# Altium footprint library Miscellaneous.PcbLib: 74 footprints (part 3 of 5)
Each footprint in its own frame and in the unit in brackets; x right, y up, seen from the top. Pads: shape width x height; smd on the part's side, far side on the other; paste and mask are expansions set on the pad; w line width, h text height; cw(c..) or ccw(c..) is an arc to the next point about the centre after c.
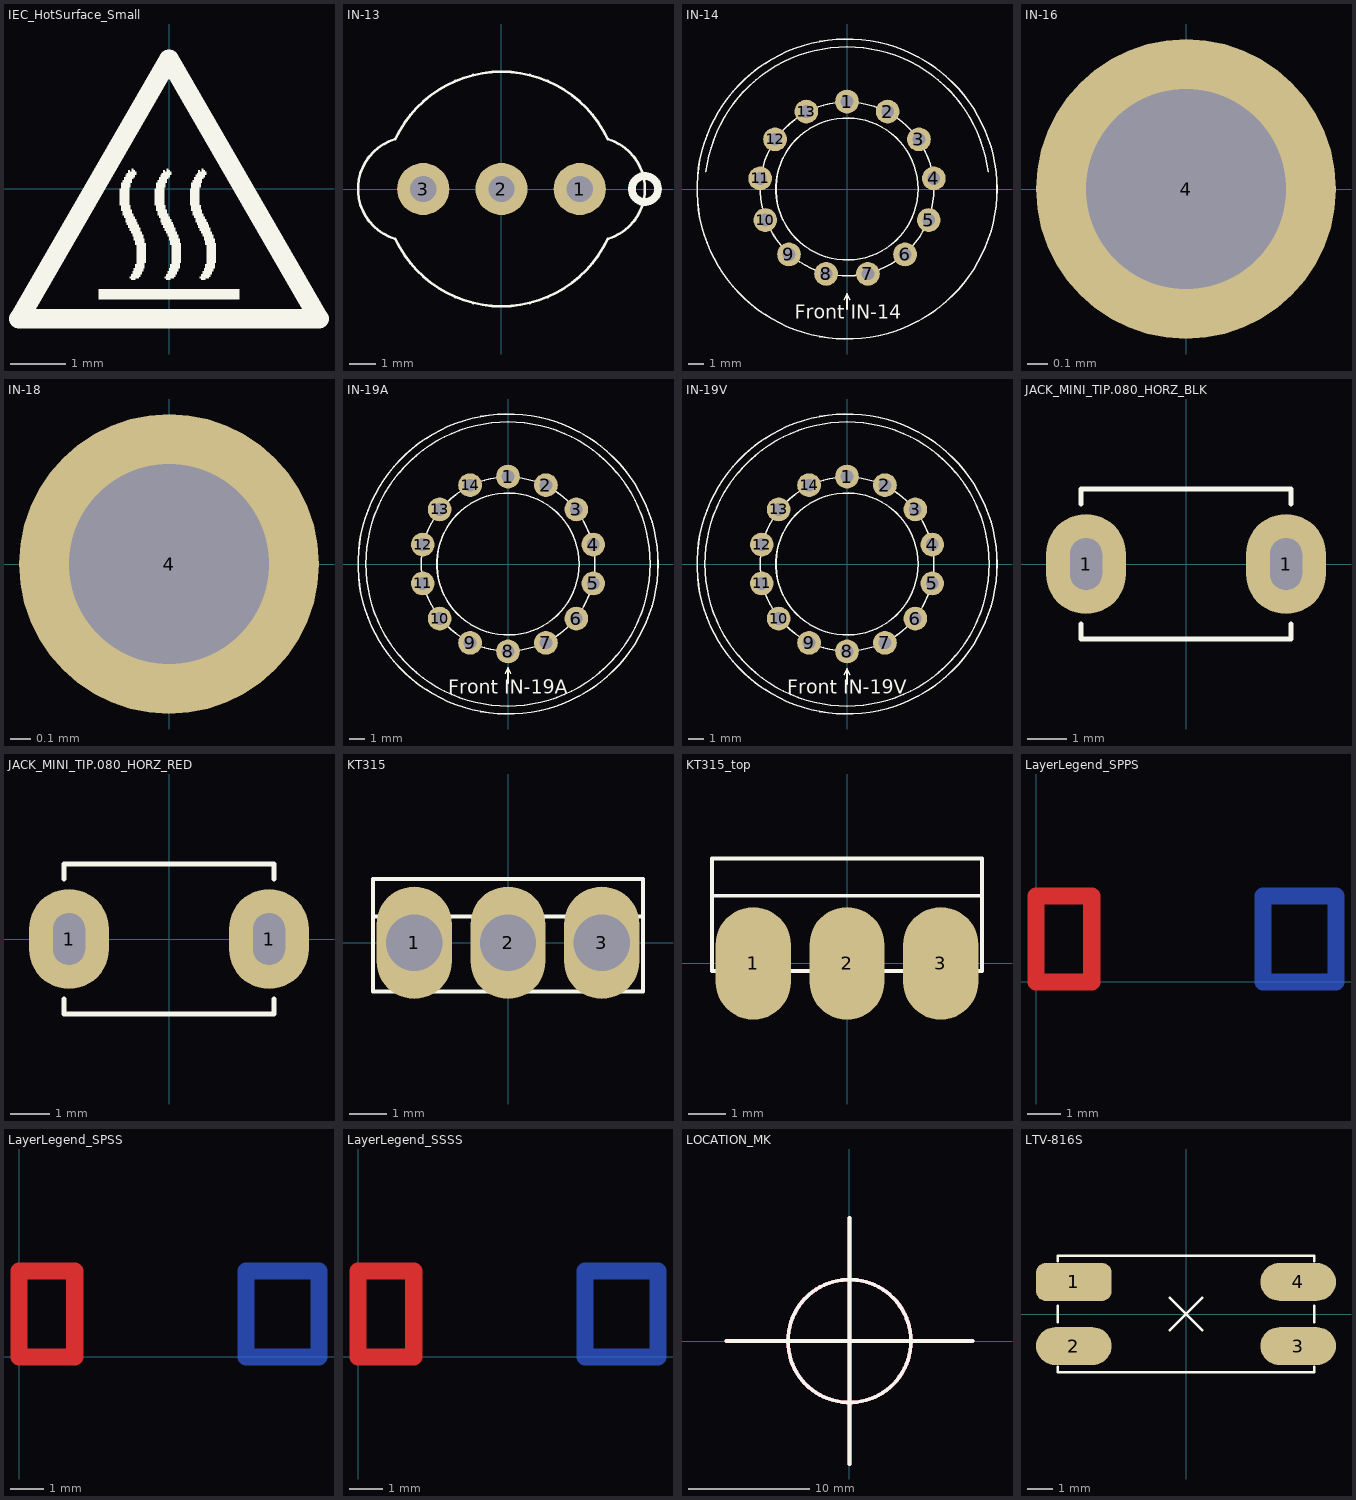
[diagram p2: the footprints below, top view; thin cyan lines are the x and y axes]

## IEC_HotSurface_Small [mil]
height 43.31
Top Overlay:
  drawing of 10 lines, arcs and shapes, not listed

## IN-13 [mm]
pads (3):
  round 2 hole 1: 1(3,0) 2(0,0) 3(-3,0)
Top Overlay:
  circle w0.3: c5.5,0 r0.5
  lines w0.1: -4.071,-1.917 ccw(c0,0) 4.071,-1.917 ccw(c3.5,0) 4.071,1.917 ccw(c0,0) -4.071,1.917 ccw(c-3.5,0) -4.071,-1.917
3D body: height 8, standoff 1, extent -5.5,-5.5 5.5,5.5
3D body: height 161, standoff 1, extent -4.464,-4.491 4.5,4.491

## IN-14 [mm]
pads (13):
  round 1.5 hole 0.8: 1(0,5.54) 2(2.575,4.905) 3(4.559,3.147) 4(5.5,0.668) 5(5.18,-1.964) 6(3.674,-4.147) 7(1.326,-5.379) 8(-1.326,-5.379) 9(-3.674,-4.147) 10(-5.18,-1.965) 11(-5.5,0.667) 12(-4.56,3.147) 13(-2.575,4.905)
Top Overlay:
  circle w0.1: c0,0 r9.5
  circle w0.1: c0,0 r4.5
  circle w0.1: c0,0 r5.5
  lines w0.1: -8.934,1.085 cw(c0,0) 8.934,1.084 ; -0.176,-6.996 0,-6.644 ; 0,-7.604 0,-6.644 ; 0.176,-6.996 0,-6.644
  text "Front IN-14" at -3.305,-8.514 h1.5
Bottom Overlay:
  text "Anode" at 1.912,6.568 h1.5
  text "k\",\"" at -2.582,6.291 h1.5
  text "k\"1\"" at -5.097,3.801 h1.5
  text "k\"2\"" at -6.376,0.427 h1.5
  text "k\"3\"" at -5.941,-3.148 h1.5
  text "k\"4\"" at -3.891,-6.124 h1.5
  text "k\"5\"" at -0.576,-7.307 h1.5
  text "k\"6\"" at 2.794,-7.309 h1.5
  text "k\"7\"" at 5.777,-5.749 h1.5
  text "k\"8\"" at 8.159,-3.147 h1.5
  text "k\"9\"" at 8.594,0.435 h1.5
  text "k\"0\"" at 7.314,3.81 h1.5
  text "k\",\"" at 4.426,6.292 h1.5
3D body "User Library-IN-14.step": height 62.61, standoff 0, extent -9.3,-9.5 9.3,9.3

## IN-16 [mm]
pads (1):
  round 1.5 hole 1: 4(0,0)

## IN-18 [mm]
pads (1):
  round 1.5 hole 1: 4(0,0)
3D body "User Library-in-18.step": height 75, standoff -11, extent -16,-16 16,16

## IN-19A [mm]
pads (14):
  round 1.5 hole 0.8: 1(0,5.54) 2(2.404,4.991) 3(4.331,3.454) 4(5.401,1.233) 5(5.401,-1.233) 6(4.331,-3.454) 7(2.404,-4.991) 8(0,-5.54) 9(-2.404,-4.991) 10(-4.331,-3.454) 11(-5.401,-1.233) 12(-5.401,1.232) 13(-4.332,3.454) 14(-2.404,4.991)
Top Overlay:
  circle w0.1: c0,0 r4.5
  circle w0.1: c0,0 r5.5
  circle w0.1: c0,0 r9.5
  circle w0.1: c0,0 r9
  lines w0.1: -0.176,-6.932 0,-6.58 ; 0,-7.54 0,-6.58 ; 0.176,-6.932 0,-6.58
  text "Front IN-19A" at -3.785,-8.514 h1.5
Bottom Overlay:
  text "k\"%\"" at 1.722,6.813 h1.5
  text "nc" at 4.846,4.738 h1.5
  text "k\"M\"" at 6.544,2.269 h1.5
  text "k\"m\"" at 4.601,-4.221 h1.5
  text "nc" at 2.397,-5.995 h1.5
  text "Anode" at -1.912,-6.568 h1.5
  text "nc" at -3.712,-5.995 h1.5
  text "k\"K\"" at -7.078,-4.222 h1.5
  text "k\"n\"" at -8.46,-1.198 h1.5
  text "k\"u\"" at -8.46,2.15 h1.5
  text "nc" at -6.162,4.737 h1.5
  text "k\"P\"" at 6.168,-1.198 h1.5
  text "k\"grC\"" at -4.871,6.69 h1.5
  text "nc" at -0.658,7.388 h1.5
3D body: height 59.5, standoff 5, extent -9.5,-9.493 9.5,9.493

## IN-19V [mm]
pads (14):
  round 1.5 hole 0.8: 1(0,5.54) 2(2.404,4.991) 3(4.331,3.454) 4(5.401,1.233) 5(5.401,-1.233) 6(4.331,-3.454) 7(2.404,-4.991) 8(0,-5.54) 9(-2.404,-4.991) 10(-4.331,-3.454) 11(-5.401,-1.233) 12(-5.401,1.232) 13(-4.332,3.454) 14(-2.404,4.991)
Top Overlay:
  circle w0.1: c0,0 r9.5
  circle w0.1: c0,0 r9
  circle w0.1: c0,0 r5.5
  circle w0.1: c0,0 r4.5
  lines w0.1: -0.176,-6.996 0,-6.644 ; 0,-7.604 0,-6.644 ; 0.176,-6.996 0,-6.644
  text "Front IN-19V" at -3.779,-8.514 h1.5
Bottom Overlay:
  text "nc" at 0.658,7.388 h1.5
  text "k\"dB\"" at -1.499,6.815 h1.5
  text "k\"~\"" at 8.478,-1.198 h1.5
  text "nc" at -4.846,4.737 h1.5
  text "k\"+\"" at -6.224,2.157 h1.5
  text "k\">\"" at -6.223,-1.198 h1.5
  text "k\"-\"" at -4.936,-4.222 h1.5
  text "nc" at -2.396,-5.995 h1.5
  text "Anode" at 1.913,-6.568 h1.5
  text "nc" at 3.713,-5.995 h1.5
  text "k\"<\"" at 7.023,-4.221 h1.5
  text "k\"А/В\"" at 9.593,2.289 h1.5
  text "nc" at 6.162,4.738 h1.5
  text "k\"П\"" at 4.163,6.831 h1.5
3D body: height 59.5, standoff 5, extent -9.5,-9.493 9.5,9.493

## JACK_MINI_TIP.080_HORZ_BLK [mil] "TIP JACK, MINIATURE HORIZONTAL PC MOUNT FOR .080 DIA PLUG"
height 213
pads (2):
  oval 80x100 hole 32 slot 52 at 90 deg: 1(-100,0) 1(100,0)
Top Overlay:
  lines w5: -105,-60 -105,-75 105,-75 105,-60 ; -105,60 -105,75 105,75 105,60
3D body "TipJack .080 Dia black with plug.STEP": height 224.41, standoff -125, extent -1008.68,-99.89 226.32,99.68

## JACK_MINI_TIP.080_HORZ_RED [mil] "TIP JACK, MINIATURE HORIZONTAL PC MOUNT FOR .080 DIA PLUG"
height 213
pads (2):
  oval 80x100 hole 32 slot 52 at 90 deg: 1(-100,0) 1(100,0)
Top Overlay:
  lines w5: -105,-60 -105,-75 105,-75 105,-60 ; -105,60 -105,75 105,75 105,60
3D body "TipJack .080 Dia red with plug.STEP": height 224.41, standoff -125, extent -1008.68,-99.89 226.32,99.68

## KT315 [mm]
pads (3):
  oval 2x3 hole 1.5: 1(-2.5,0) 2(0,0) 3(2.5,0)
Top Overlay:
  lines w0.1: -3.6,0.7 3.6,0.7 ; -3.6,-1.3 -3.6,1.7 3.6,1.7 3.6,-1.3 -3.6,-1.3
3D body "User Library-KT315 and KT361 mid.STEP": height 5.67, standoff -3.33, extent -3.6,-1.3 3.6,1.7

## KT315_top [mm]
pads (3):
  oval 2x3 smd: 1(-2.5,0) 2(0,0) 3(2.5,0)
Top Overlay:
  lines w0.1: -3.6,1.8 3.6,1.8 ; -3.6,-0.2 3.6,-0.2 3.6,2.8 -3.6,2.8 -3.6,-0.2
3D body "User Library-KT315 and KT361 angle.STEP": height 6.17, standoff 0.07, extent -3.6,-0.958 3.6,2.8

## LayerLegend_SPPS [mil]
Top Layer:
  lines w20: 0,0 0,100 65,100 65,0 0,0
  text "1" at 25,25 h50
Mid-Layer 1:
  rectangle: 160,10 340,90
  rectangle: 10,10 75,90
  text "2" at 100,25 h50
Mid-Layer 2:
  rectangle: 255,10 340,90
  rectangle: 10,10 170,90
  text "3" at 195,25 h50
Bottom Layer:
  lines w20: 265,0 265,100 350,100 350,0 265,0
  text "4" at 290,25 h50

## LayerLegend_SPSS [mil]
Top Layer:
  lines w20: 0,0 0,100 65,100 65,0 0,0
  text "1" at 25,25 h50
Mid-Layer 1:
  rectangle: 160,10 340,90
  rectangle: 10,10 75,90
  text "2" at 100,25 h50
Mid-Layer 2:
  lines w20: 170,0 170,100 255,100 255,0 170,0
  text "3" at 195,25 h50
Bottom Layer:
  lines w20: 265,0 265,100 350,100 350,0 265,0
  text "4" at 290,25 h50

## LayerLegend_SSSS [mil]
Top Layer:
  lines w20: 0,0 0,100 65,100 65,0 0,0
  text "1" at 25,25 h50
Mid-Layer 1:
  lines w20: 75,0 75,100 160,100 160,0 75,0
  text "2" at 100,25 h50
Mid-Layer 2:
  lines w20: 170,0 170,100 255,100 255,0 170,0
  text "3" at 195,25 h50
Bottom Layer:
  lines w20: 265,0 265,100 350,100 350,0 265,0
  text "4" at 290,25 h50

## LOCATION_MK [mil]
Top Layer:
  circle w12: c0,0 r200
  circle w12: c0,0 r200
  lines w12: -400,0 400,0 -400,0 ; 0,-400 0,400 0,-400
Mid-Layer 1:
  circle w12: c0,0 r200
  lines w12: -400,0 400,0 ; 0,-400 0,400
Mid-Layer 14:
  circle w12: c0,0 r200
  lines w12: -400,0 400,0 ; 0,-400 0,400
Bottom Layer:
  circle w12: c0,0 r200
  circle w12: c0,0 r200
  lines w12: -400,0 400,0 -400,0 ; 0,-400 0,400 0,-400
Top Overlay:
  circle w12: c0,0 r200
  circle w12: c0,0 r200
  lines w12: -400,0 400,0 -400,0 ; 0,-400 0,400 0,-400
Bottom Overlay:
  circle w12: c0,0 r200
  circle w12: c0,0 r200
  lines w12: -400,0 400,0 -400,0 ; 0,-400 0,400 0,-400
Top Paste:
  circle w12: c0,0 r200
  circle w12: c0,0 r200
  lines w12: -400,0 400,0 -400,0 ; 0,-400 0,400 0,-400
Bottom Paste:
  circle w12: c0,0 r200
  circle w12: c0,0 r200
  lines w12: -400,0 400,0 -400,0 ; 0,-400 0,400 0,-400
Top Solder:
  circle w12: c0,0 r200
  circle w12: c0,0 r200
  lines w12: -400,0 400,0 -400,0 ; 0,-400 0,400 0,-400
Bottom Solder:
  circle w12: c0,0 r200
  circle w12: c0,0 r200
  lines w12: -400,0 400,0 -400,0 ; 0,-400 0,400 0,-400
Internal Plane 1:
  circle w12: c0,0 r200
  circle w12: c0,0 r200
  lines w12: -400,0 400,0 -400,0 ; 0,-400 0,400 0,-400
Internal Plane 2:
  circle w12: c0,0 r200
  circle w12: c0,0 r200
  lines w12: -400,0 400,0 -400,0 ; 0,-400 0,400 0,-400
Drill Guide:
  circle w12: c0,0 r200
  circle w12: c0,0 r200
  lines w12: -400,0 400,0 -400,0 ; 0,-400 0,400 0,-400
Keep-Out Layer:
  circle w12: c0,0 r200
  circle w12: c0,0 r200
  lines w12: -400,0 400,0 -400,0 ; 0,-400 0,400 0,-400
Mechanical 1:
  circle w12: c0,0 r200
  circle w12: c0,0 r200
  lines w12: -400,0 400,0 -400,0 ; 0,-400 0,400 0,-400
Mechanical 4:
  circle w12: c0,0 r200
  circle w12: c0,0 r200
  lines w12: -400,0 400,0 -400,0 ; 0,-400 0,400 0,-400
Drill Drawing:
  circle w12: c0,0 r200
  circle w12: c0,0 r200
  lines w12: -400,0 400,0 -400,0 ; 0,-400 0,400 0,-400

## LTV-816S [mm] "SOIC, 8-Leads, Body 4.9x3.9mm, Pitch 1.27mm, IPC Low Density"
height 1.76
pads (4):
  rrect50% 3x1.5 smd: 1(-4.445,1.27)
  oval 3x1.5 smd: 2(-4.445,-1.27) 3(4.445,-1.27) 4(4.445,1.27)
Top Overlay:
  lines w0.1: -5.08,-2.1 -5.08,-2.3 5.08,-2.3 5.08,-2.1 ; -5.08,-0.318 -5.08,0.318 ; -5.08,2.1 -5.08,2.3 5.08,2.3 5.08,2.1 ; -0.635,-0.635 0.635,0.635 ; -0.635,0.635 0.635,-0.635 ; 5.08,-0.318 5.08,0.318
3D body "User Library-LTV816S.STEP": height 3.71, standoff -0.03, extent -5.257,-2.182 5.257,2.4